# Altium integrated library Connector.IntLib: 213 symbols (part 1 of 2)
Pins are listed as number, name and electrical type; pins without a type are passive.

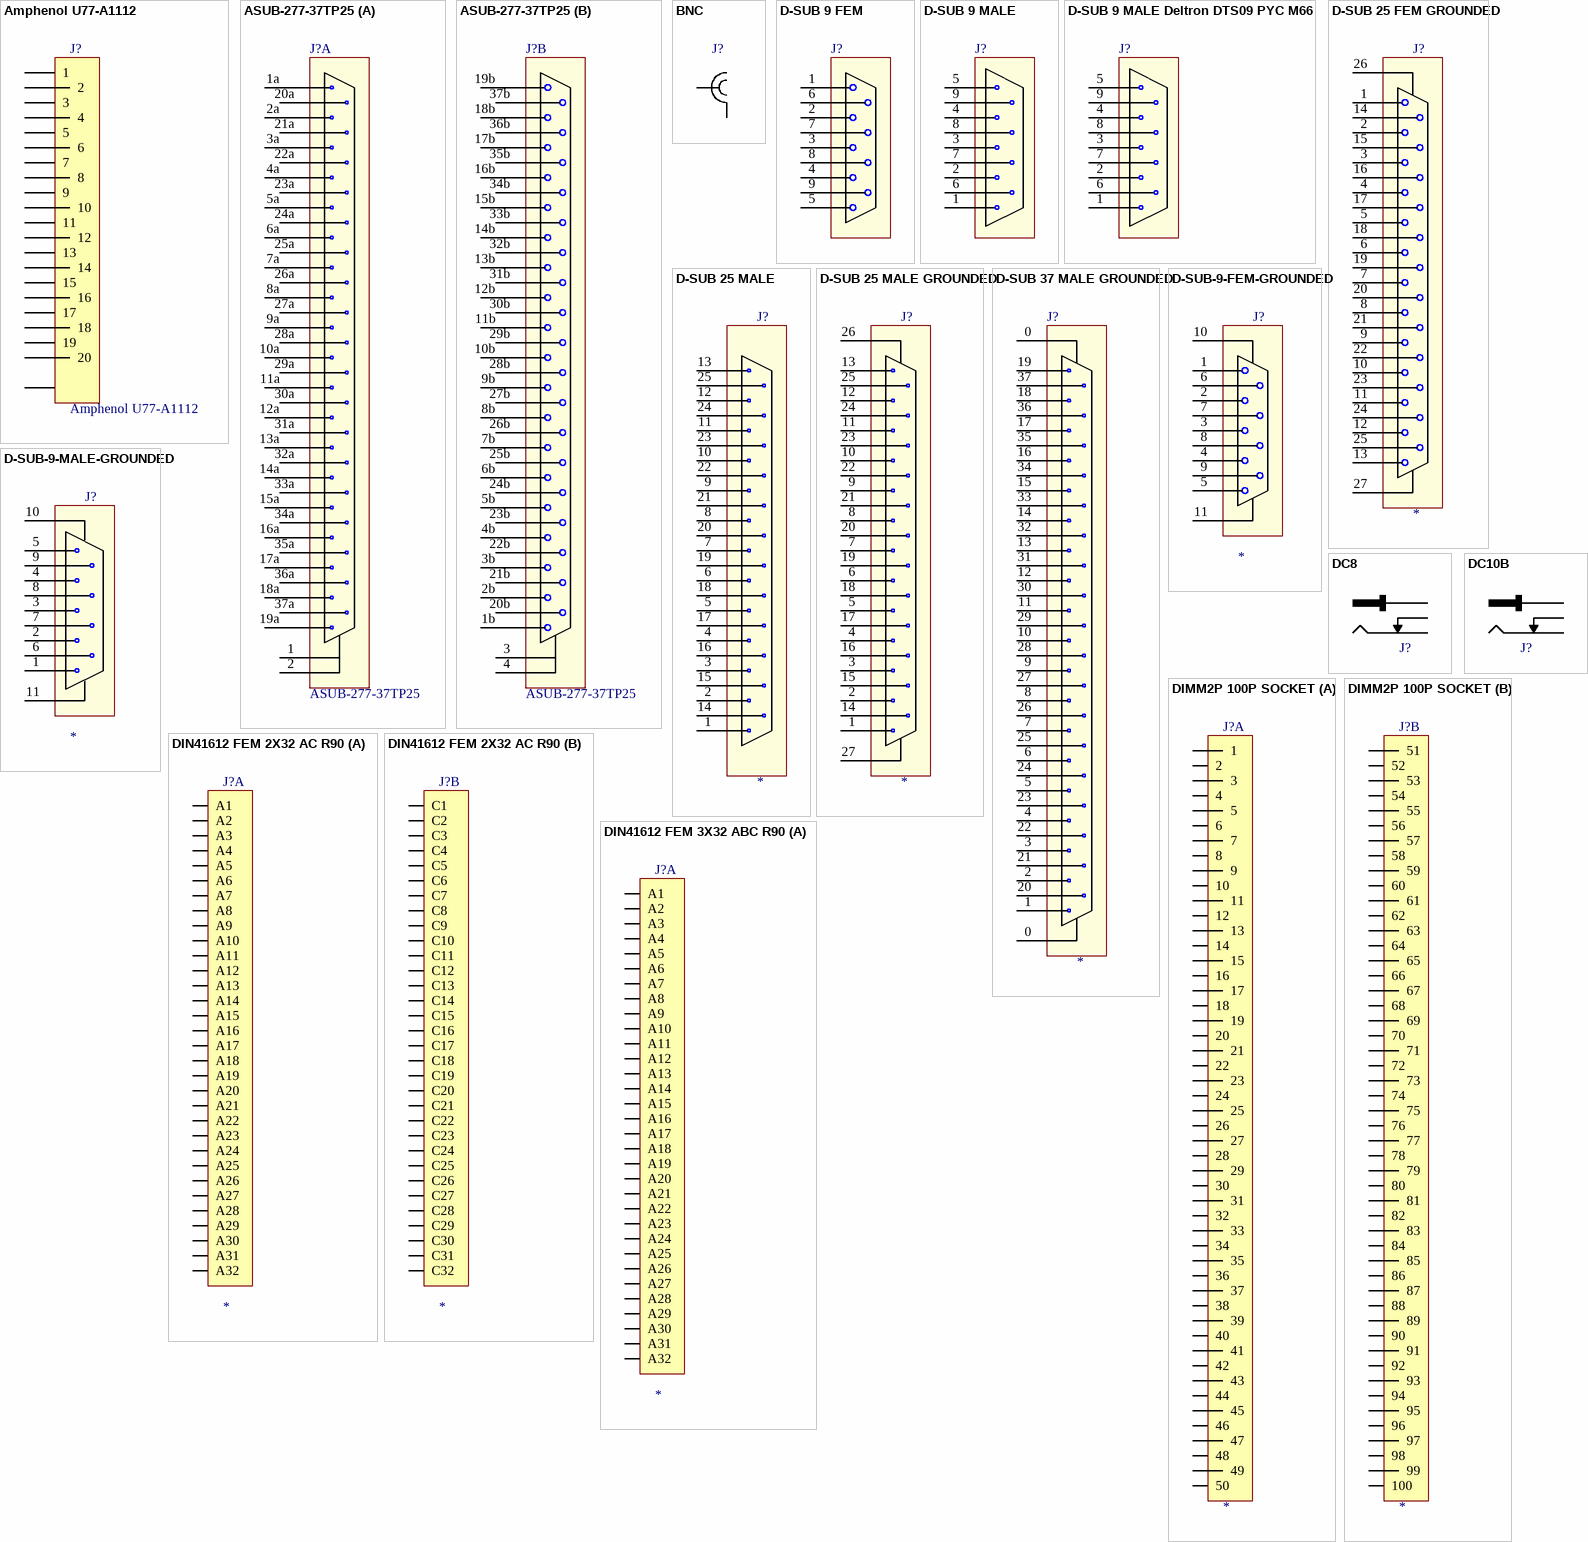
[diagram p0: symbols Amphenol U77-A1112 to DIN41612 FEM 3X32 ABC R90]

## Amphenol U77-A1112
designator J?
SFP20 High Speed Connector; Value: Amphenol U77-A1112
footprint Amphenol U77-A1112 (SFP20 High Speed Connector)
pins: 1, 2, 3, 4, 5, 6, 7, 8, 9, 10, 11, 12, 13, 14, 15, 16, 17, 18, 19, 20, 21 Case

## ASUB-277-37TP25
designator J?
D-Sub 25 pôles standard angle female, solder pin with nut and groundig board lock; Manufacturer: ASSMANN WSW Components; Value: ASUB-277-37TP25; DigiKey No: AE10967-ND
footprint ASUB-277-37TP25
part A pins: 1, 1a, 2, 2a, 3a, 4a, 5a, 6a, 7a, 8a, 9a, 10a, 11a, 12a, 13a, 14a, 15a, 16a, 17a, 18a, 19a, 20a, 21a, 22a, 23a, 24a, 25a, 26a, 27a, 28a, 29a, 30a, 31a, 32a, 33a, 34a, 35a, 36a, 37a
part B pins: 1b, 2b, 3, 3b, 4, 4b, 5b, 6b, 7b, 8b, 9b, 10b, 11b, 12b, 13b, 14b, 15b, 16b, 17b, 18b, 19b, 20b, 21b, 22b, 23b, 24b, 25b, 26b, 27b, 28b, 29b, 30b, 31b, 32b, 33b, 34b, 35b, 36b, 37b

## BNC
designator J?  (value not drawn)
footprint BNC TH RIGHT ANGLE TE CONNECTIVITY 1-1337543-0
footprint BNC TH Vertical Molex 73171-1900 (Connector BNC TH Vertical Molex 73171-1900)
pins: 1, 2

## D-SUB 9 FEM
designator J?  (value not drawn)
D-SUB 9 FEMALE, SOLDER CUP; value: *
footprint D-SUB 9 FEM
pins: 1, 2, 3, 4, 5, 6, 7, 8, 9

## D-SUB 9 MALE
designator J?  (value not drawn)
D-SUB 9 MALE, SOLDER CUP; value: *
footprint D-SUB 9 MALE
pins: 1, 2, 3, 4, 5, 6, 7, 8, 9

## D-SUB 9 MALE Deltron DTS09 PYC M66
designator J?  (value not drawn)
D-SUB 9 MALE Deltron DTS09 PYC M66; value: *
footprint D-SUB 9 MALE Deltron DTS09 PYC M66
pins: 1, 2, 3, 4, 5, 6, 7, 8, 9

## D-SUB 25 FEM GROUNDED
designator J?
D-Sub 25 pôles standard angle female, solder pin with nut and groundig board lock; value: *
footprint D-SUB 25 FEM (Deltron DTS 25 SYC M66)
pins: 1, 2, 3, 4, 5, 6, 7, 8, 9, 10, 11, 12, 13, 14, 15, 16, 17, 18, 19, 20, 21, 22, 23, 24, 25, 26, 27

## D-SUB 25 MALE
designator J?
D-Sub 25 pôles standard angle male, solder pin with nut and groundig board lock; value: *
footprint D-SUB 25 MALE 2 LAYERS (D-SUB 25 MALE 2 LAYERS PIN)
pins: 1, 2, 3, 4, 5, 6, 7, 8, 9, 10, 11, 12, 13, 14, 15, 16, 17, 18, 19, 20, 21, 22, 23, 24, 25

## D-SUB 25 MALE GROUNDED
designator J?
D-Sub 25 pôles standard angle male, solder pin with nut and groundig board lock; value: *
footprint D-SUB 25 MALE (Deltron DTS 25 PYC M66)
pins: 1, 2, 3, 4, 5, 6, 7, 8, 9, 10, 11, 12, 13, 14, 15, 16, 17, 18, 19, 20, 21, 22, 23, 24, 25, 26, 27

## D-SUB 37 MALE GROUNDED
designator J?
D-Sub 37 pôles standard straight male, solder pin with nut and groundig board lock; value: Harting 09 65 461 6712
footprint D-SUB 37 MALE STRAIGHT (Harting 09 65 461 6712)
pins: 0, 0, 1, 2, 3, 4, 5, 6, 7, 8, 9, 10, 11, 12, 13, 14, 15, 16, 17, 18, 19, 20, 21, 22, 23, 24, 25, 26, 27, 28, 29, 30, 31, 32, 33, 34, 35, 36, 37

## D-SUB-9-FEM-GROUNDED
designator J?
D-Sub 9 pôles standard angle female, solder pin with nut and groundig board lock; value: *
footprint D-SUB-9-FEM-ANGLE (D-SUB9F HARTING)
pins: 1, 2, 3, 4, 5, 6, 7, 8, 9, 10, 11

## D-SUB-9-MALE-GROUNDED
designator J?
D-Sub 9 pôles standard angle male, solder pin with nut and groundig board lock; value: *
footprint D-SUB-9-MALE-ANGLE (D-SUB9M HARTING)
pins: 1, 2, 3, 4, 5, 6, 7, 8, 9, 10, 11

## DC8
designator J?  (value not drawn)
DC Power Connector Cliff DC8; Value: DC8
footprint DC8 CLIFF (DC power Connector Cliff DC8)
pins: 1, 2, 3

## DC10B
designator J?  (value not drawn)
DC Power Connector Cliff DC10B; Value: DC10B
footprint DC10B CLIFF (DC power Connector Cliff DC10B)
pins: 1, 2, 3

## DIMM2P 100P SOCKET
designator J?
DIMM2P 100P SOCKET
footprint DIMM2P 100P SOCKET
part A pins: 1, 2, 3, 4, 5, 6, 7, 8, 9, 10, 11, 12, 13, 14, 15, 16, 17, 18, 19, 20, 21, 22, 23, 24, 25, 26, 27, 28, 29, 30, 31, 32, 33, 34, 35, 36, 37, 38, 39, 40, 41, 42, 43, 44, 45, 46, 47, 48, 49, 50
part B pins: 51, 52, 53, 54, 55, 56, 57, 58, 59, 60, 61, 62, 63, 64, 65, 66, 67, 68, 69, 70, 71, 72, 73, 74, 75, 76, 77, 78, 79, 80, 81, 82, 83, 84, 85, 86, 87, 88, 89, 90, 91, 92, 93, 94, 95, 96, 97, 98, 99, 100

## DIN41612 FEM 2X32 AC R90
designator J?
DIN41612 FEM 2X32 AC R90
footprint DIN41612 FEM 2x32 AC R90 (DIN41612 FEM 2X32 R90)
part A pins: A1, A2, A3, A4, A5, A6, A7, A8, A9, A10, A11, A12, A13, A14, A15, A16, A17, A18, A19, A20, A21, A22, A23, A24, A25, A26, A27, A28, A29, A30, A31, A32
part B pins: C1, C2, C3, C4, C5, C6, C7, C8, C9, C10, C11, C12, C13, C14, C15, C16, C17, C18, C19, C20, C21, C22, C23, C24, C25, C26, C27, C28, C29, C30, C31, C32

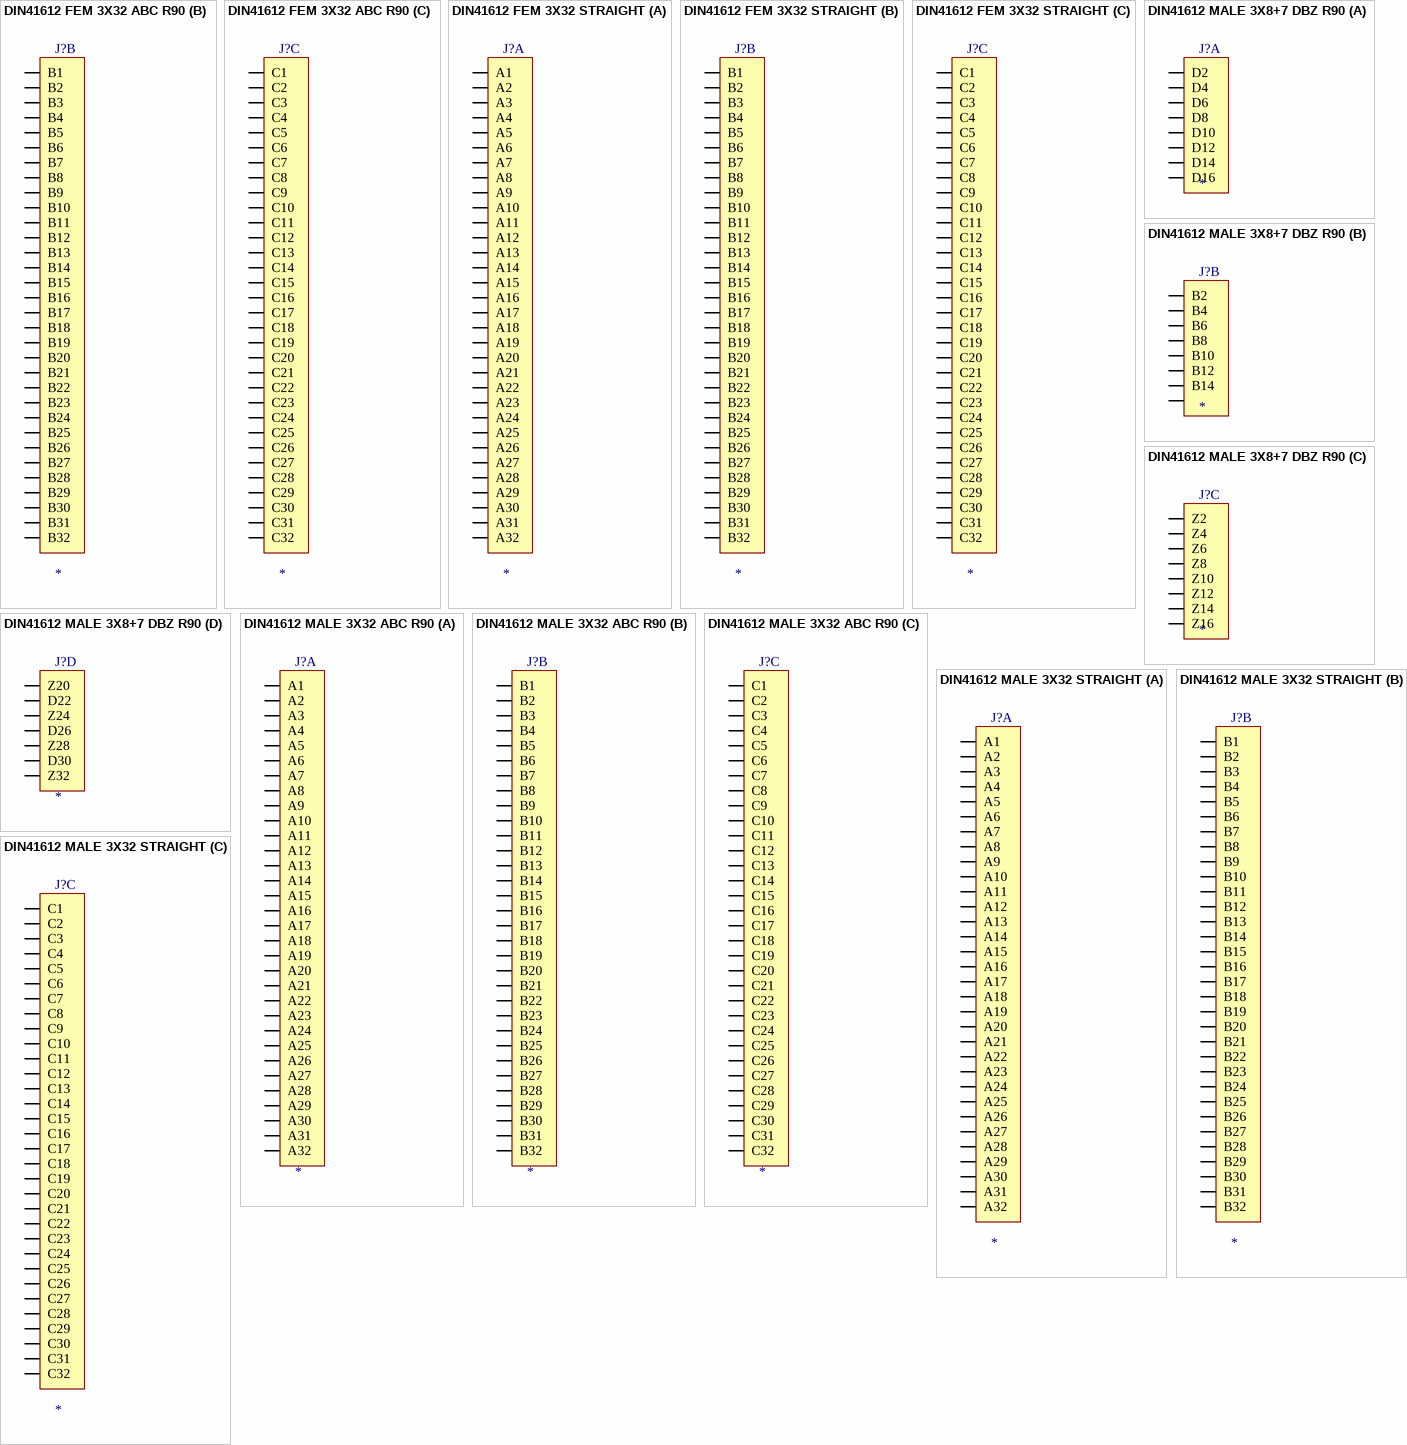
[diagram p1: symbols DIN41612 FEM 3X32 ABC R90 to DIN41612 MALE 3X32 STRAIGHT]

## DIN41612 FEM 3X32 ABC R90
designator J?
DIN41612 FEM 3X32 ABC R90
footprint DIN41612 FEM 3x32 ABC R90
part A pins: A1, A2, A3, A4, A5, A6, A7, A8, A9, A10, A11, A12, A13, A14, A15, A16, A17, A18, A19, A20, A21, A22, A23, A24, A25, A26, A27, A28, A29, A30, A31, A32
part B pins: B1, B2, B3, B4, B5, B6, B7, B8, B9, B10, B11, B12, B13, B14, B15, B16, B17, B18, B19, B20, B21, B22, B23, B24, B25, B26, B27, B28, B29, B30, B31, B32
part C pins: C1, C2, C3, C4, C5, C6, C7, C8, C9, C10, C11, C12, C13, C14, C15, C16, C17, C18, C19, C20, C21, C22, C23, C24, C25, C26, C27, C28, C29, C30, C31, C32

## DIN41612 FEM 3X32 STRAIGHT
designator J?
DIN41612 FEM 3X32 ABC STRAIGHT
footprint DIN41612 FEM 3x32 ABC Straight (DIN41612 FEM 3x32 ABC Straight Harting 09 03 296 6824)
part A pins: A1, A2, A3, A4, A5, A6, A7, A8, A9, A10, A11, A12, A13, A14, A15, A16, A17, A18, A19, A20, A21, A22, A23, A24, A25, A26, A27, A28, A29, A30, A31, A32
part B pins: B1, B2, B3, B4, B5, B6, B7, B8, B9, B10, B11, B12, B13, B14, B15, B16, B17, B18, B19, B20, B21, B22, B23, B24, B25, B26, B27, B28, B29, B30, B31, B32
part C pins: C1, C2, C3, C4, C5, C6, C7, C8, C9, C10, C11, C12, C13, C14, C15, C16, C17, C18, C19, C20, C21, C22, C23, C24, C25, C26, C27, C28, C29, C30, C31, C32

## DIN41612 MALE 3X8+7 DBZ R90
designator J?
DIN41612 MALE 3X8+7 DBZ R90 Harting 09 06 131 6922
footprint DIN41612 MALE 3X8+7 DBZ R90 (DIN41612 MALE 3X8+7 DBZ R90 Harting 09 06 131 6922)
part A pins: D2, D4, D6, D8, D10, D12, D14, D16
part B pins: B2, B4, B6, B8, B10, B12, B14, B16
part C pins: Z2, Z4, Z6, Z8, Z10, Z12, Z14, Z16
part D pins: D22, D26, D30, Z20, Z24, Z28, Z32

## DIN41612 MALE 3X32 ABC R90
designator J?
DIN41612 MALE 3X32 ABC R90
footprint DIN41612 MALE 3X32 ABC R90
part A pins: A1, A2, A3, A4, A5, A6, A7, A8, A9, A10, A11, A12, A13, A14, A15, A16, A17, A18, A19, A20, A21, A22, A23, A24, A25, A26, A27, A28, A29, A30, A31, A32
part B pins: B1, B2, B3, B4, B5, B6, B7, B8, B9, B10, B11, B12, B13, B14, B15, B16, B17, B18, B19, B20, B21, B22, B23, B24, B25, B26, B27, B28, B29, B30, B31, B32
part C pins: C1, C2, C3, C4, C5, C6, C7, C8, C9, C10, C11, C12, C13, C14, C15, C16, C17, C18, C19, C20, C21, C22, C23, C24, C25, C26, C27, C28, C29, C30, C31, C32

## DIN41612 MALE 3X32 STRAIGHT
designator J?
DIN41612 MALE 3X32 ABC STRAIGHT
footprint DIN41612 MALE 3x32 ABC Straight (DIN41612 MALE 3x32 ABC Straight Harting 09 73 196 7902)
part A pins: A1, A2, A3, A4, A5, A6, A7, A8, A9, A10, A11, A12, A13, A14, A15, A16, A17, A18, A19, A20, A21, A22, A23, A24, A25, A26, A27, A28, A29, A30, A31, A32
part B pins: B1, B2, B3, B4, B5, B6, B7, B8, B9, B10, B11, B12, B13, B14, B15, B16, B17, B18, B19, B20, B21, B22, B23, B24, B25, B26, B27, B28, B29, B30, B31, B32
part C pins: C1, C2, C3, C4, C5, C6, C7, C8, C9, C10, C11, C12, C13, C14, C15, C16, C17, C18, C19, C20, C21, C22, C23, C24, C25, C26, C27, C28, C29, C30, C31, C32

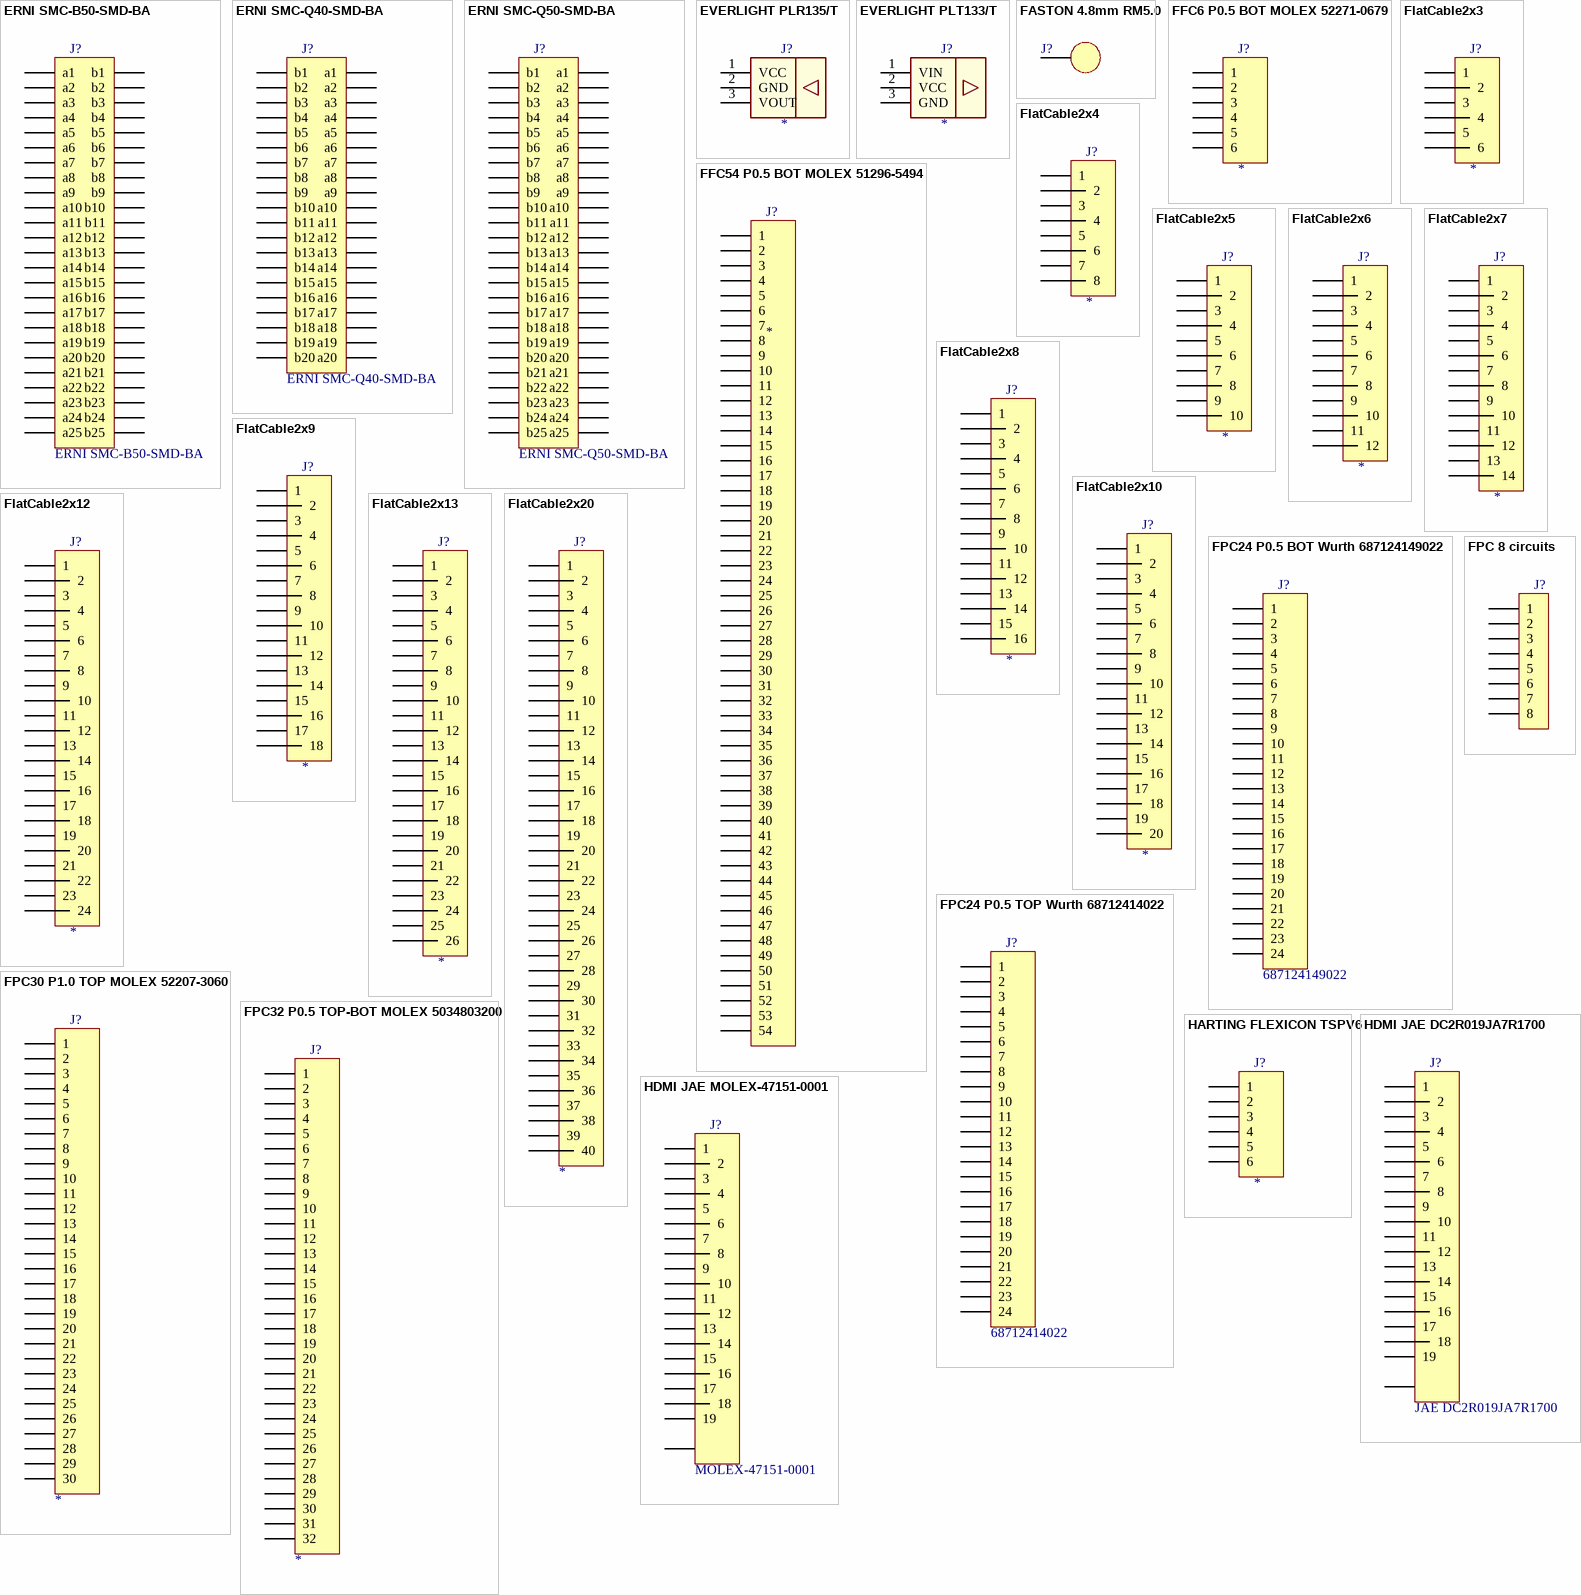
[diagram p2: symbols ERNI SMC-B50-SMD-BA to HDMI JAE MOLEX-47151-0001]

## ERNI SMC-B50-SMD-BA
designator J?
Female 1.27 pitch 2x25 pin connector
footprint ERNI SMC-B50-SMD-BA (Footprint not found)
pins: a1, a2, a3, a4, a5, a6, a7, a8, a9, a10, a11, a12, a13, a14, a15, a16, a17, a18, a19, a20, a21, a22, a23, a24, a25, b1, b2, b3, b4, b5, b6, b7, b8, b9, b10, b11, b12, b13, b14, b15, b16, b17, b18, b19, b20, b21, b22, b23, b24, b25

## ERNI SMC-Q40-SMD-BA
designator J?
Male 1.27 pitch 2x20 pin connector
footprint ERNI SMC-Q40-SMD-BA (Male 1.27 pitch 2x20 pin connector, 6.75 height)
pins: a1, a2, a3, a4, a5, a6, a7, a8, a9, a10, a11, a12, a13, a14, a15, a16, a17, a18, a19, a20, b1, b2, b3, b4, b5, b6, b7, b8, b9, b10, b11, b12, b13, b14, b15, b16, b17, b18, b19, b20

## ERNI SMC-Q50-SMD-BA
designator J?
Male 1.27 pitch 2x25 pin connector
footprint ERNI SMC-Q50-SMD-BA (Male 1.27 pitch 2x20 pin connector, 6.75 height)
pins: a1, a2, a3, a4, a5, a6, a7, a8, a9, a10, a11, a12, a13, a14, a15, a16, a17, a18, a19, a20, a21, a22, a23, a24, a25, b1, b2, b3, b4, b5, b6, b7, b8, b9, b10, b11, b12, b13, b14, b15, b16, b17, b18, b19, b20, b21, b22, b23, b24, b25

## EVERLIGHT PLR135/T
designator J?
EVERLIGHT Optic Receiver PLR135/T - Transmitter PLT133/T; value: *
footprint EVERLIGHT PLx13x/T (Optic Receiver PLR135/T - Transmitter PLT133/T)
pins: 1 VCC, 2 GND, 3 VOUT

## EVERLIGHT PLT133/T
designator J?
EVERLIGHT Optic Receiver PLR135/T - Transmitter PLT133/T; value: *
footprint EVERLIGHT PLx13x/T (Optic Receiver PLR135/T - Transmitter PLT133/T)
pins: 1 VIN, 2 VCC, 3 GND

## FASTON 4.8mm RM5.0
designator J?, comment SOCKET 2PIN  (value not drawn)
FASTON 4.8mm RM5.0
footprint FASTON 4.8mm RM5 (Faston 4.8mm RM5)
pins: 1, 2, 2

## FFC6 P0.5 BOT MOLEX 52271-0679
designator J?
FFC/FPC Connector, Right-Angle, Surface Mount, ZIF, Bottom Contact Style, 6 Circuits
footprint FFC6 P0.5 BOT MOLEX 52271-0679
pins: 1, 2, 3, 4, 5, 6

## FFC54 P0.5 BOT MOLEX 51296-5494
designator J?
FFC/FPC Connector, 1.30mm Height, Right-Angle, Surface Mount, ZIF, Bottom Contact Style, 54 Circuits
footprint FFC54 P0.5 BOT MOLEX 52271-0679 (FFC/FPC Connector, Right-Angle, Surface Mount, ZIF, Bottom Contact Style, 6 Circuits)
pins: 1, 2, 3, 4, 5, 6, 7, 8, 9, 10, 11, 12, 13, 14, 15, 16, 17, 18, 19, 20, 21, 22, 23, 24, 25, 26, 27, 28, 29, 30, 31, 32, 33, 34, 35, 36, 37, 38, 39, 40, 41, 42, 43, 44, 45, 46, 47, 48, 49, 50, 51, 52, 53, 54

## FlatCable2x3
designator J?
FlatCable2x3
footprint FlatCable2x3 2MM Right Angle TH FCI 98614-G61-06ULF
footprint FlatCable2x3 2MM Straight TH FCI 98414-G06-06ULF
footprint FlatCable2x3 2MM Straight SMD FCI 98414-G52-06ALF
footprint FlatCable2x3 2.54MM Straight TH (FlatCable2x3 2.54MM Straight TH, DIN 41651, Generic)
footprint FlatCable2x3 2.54MM RIGHT ANGLE TH (FlatCable2x3 2.54MM Right Angle TH, DIN 41651, Generic)
footprint FlatCable2x3 2.54MM A Straight TH (FlatCable2x3 2.54MM Straight TH, DIN 41651, Generic)
pins: 1, 2, 3, 4, 5, 6

## FlatCable2x4
designator J?
FlatCable2x4
footprint FlatCable2x4 2MM Right Angle TH FCI 98614-G61-08ULF
footprint FlatCable2x4 2MM Straight TH FCI 98414-G06-08ULF
footprint FlatCable2x4 2MM Straight SMD FCI 98414-G52-08ALF
pins: 1, 2, 3, 4, 5, 6, 7, 8

## FlatCable2x5
designator J?
FlatCable2x5
footprint FlatCable2x5 2MM Straight TH FCI 98414-G06-10ULF
footprint FlatCable2x5 2MM Right Angle TH FCI 98614-G61-10ULF
footprint FlatCable2x5 2MM Straight SMD FCI 98414-G52-10ALF
footprint FlatCable2x5 2.54MM Straight TH (FlatCable2x5 2.54MM Straight TH, DIN 41651, Generic)
footprint FlatCable2x5 2.54MM RIGHT ANGLE TH (FlatCable2x5 2.54MM Right Angle TH, DIN 41651, Generic)
footprint FlatCable2x5 2.54MM A Straight TH (FlatCable2x5 2.54MM Straight TH, DIN 41651, Generic)
footprint FlatCable2x5 1.27MM Straight TH (FlatCable2x5 2MM Straight TH)
footprint FlatCable2x5 1.27MM Straight SMD (FlatCable2x5 2MM Straight SMD, FCI 20021521-00010T1LF)
footprint FlatCable2x5 1.27MM Straight SMD Mini (FlatCable2x5 2MM Straight SMD, Samtec FTSH-105-01-L-DV-K-TR)
pins: 1, 2, 3, 4, 5, 6, 7, 8, 9, 10

## FlatCable2x6
designator J?
FlatCable2x6
footprint FlatCable2x6 2MM Right Angle TH FCI 98614-G61-12ULF
footprint FlatCable2x6 2MM Straight TH FCI 98414-G06-12ULF
footprint FlatCable2x6 2MM Straight SMD FCI 98414-G52-12ALF
pins: 1, 2, 3, 4, 5, 6, 7, 8, 9, 10, 11, 12

## FlatCable2x7
designator J?
FlatCable2x7
footprint FlatCable2x7 2MM Right Angle TH FCI 98614-G61-14ULF
footprint FlatCable2x7 2MM Straight TH FCI 98414-G06-14ULF
footprint FlatCable2x7 2MM Straight SMD FCI 98414-G52-14ALF
footprint FlatCable2x7 2.54MM Straight TH (FlatCable2x7 2.54MM Straight TH, DIN 41651, Generic)
footprint FlatCable2x7 2.54MM RIGHT ANGLE TH (FlatCable2x7 2.54MM Right Angle TH, DIN 41651, Generic)
footprint FlatCable2x7 2.54MM A Straight TH (FlatCable2x7 2.54MM Straight TH, DIN 41651, Generic)
pins: 1, 2, 3, 4, 5, 6, 7, 8, 9, 10, 11, 12, 13, 14

## FlatCable2x8
designator J?
FlatCable2x8
footprint FlatCable2x8 2MM Right Angle TH FCI 98614-G61-16ULF
footprint FlatCable2x8 2MM Straight TH FCI 98414-G06-16ULF
footprint FlatCable2x8 2MM Straight SMD FCI 98414-G52-16ALF
footprint FlatCable2x8 2.54MM Straight TH (FlatCable2x8 2.54MM Straight TH, DIN 41651, Generic)
footprint FlatCable2x8 2.54MM RIGHT ANGLE TH (FlatCable2x8 2.54MM Right Angle TH, DIN 41651, Generic)
footprint FlatCable2x8 2.54MM A Straight TH (FlatCable2x8 2.54MM Straight TH, DIN 41651, Generic)
pins: 1, 2, 3, 4, 5, 6, 7, 8, 9, 10, 11, 12, 13, 14, 15, 16

## FlatCable2x9
designator J?
FlatCable2x9
footprint FlatCable2x9 2MM Right Angle TH FCI 98614-G61-18ULF
footprint FlatCable2x9 2MM Straight TH FCI 98414-G06-18ULF
footprint FlatCable2x9 2MM Straight SMD FCI 98414-G52-18ALF
pins: 1, 2, 3, 4, 5, 6, 7, 8, 9, 10, 11, 12, 13, 14, 15, 16, 17, 18

## FlatCable2x10
designator J?
FlatCable2x10
footprint FlatCable2x10 2MM Right Angle TH FCI 98614-G61-20ULF
footprint FlatCable2x10 2MM Straight TH FCI 98414-G06-20ULF
footprint FlatCable2x10 2MM Straight SMD FCI 98414-G52-20ALF
footprint FlatCable2x10 2.54MM Straight TH (FlatCable2x10 2.54MM Straight TH, DIN 41651, Generic)
footprint FlatCable2x10 2.54MM RIGHT ANGLE TH (FlatCable2x10 2.54MM Right Angle TH, DIN 41651, Generic)
footprint FlatCable2x10 2.54MM A Straight TH (FlatCable2x10 2.54MM Straight TH, DIN 41651, Generic)
pins: 1, 2, 3, 4, 5, 6, 7, 8, 9, 10, 11, 12, 13, 14, 15, 16, 17, 18, 19, 20

## FlatCable2x12
designator J?
FlatCable2x12
footprint FlatCable2x12 2MM Right Angle TH FCI 98614-G61-24ULF
footprint FlatCable2x12 2MM Straight TH FCI 98414-G06-24ULF
footprint FlatCable2x12 2MM Straight SMD FCI 98414-G52-24ALF
pins: 1, 2, 3, 4, 5, 6, 7, 8, 9, 10, 11, 12, 13, 14, 15, 16, 17, 18, 19, 20, 21, 22, 23, 24

## FlatCable2x13
designator J?
FlatCable2x13
footprint FlatCable2x13 2.54MM Straight TH (FlatCable2x13 2.54MM Straight TH, DIN 41651, Generic)
footprint FlatCable2x13 2.54MM RIGHT ANGLE TH (FlatCable2x13 2.54MM Right Angle TH, DIN 41651, Generic)
footprint FlatCable2x13 2.54MM A Straight TH (FlatCable2x13 2.54MM Straight TH, DIN 41651, Generic)
pins: 1, 2, 3, 4, 5, 6, 7, 8, 9, 10, 11, 12, 13, 14, 15, 16, 17, 18, 19, 20, 21, 22, 23, 24, 25, 26

## FlatCable2x20
designator J?
FlatCable2x20
footprint FlatCable2x20 2.54MM Straight TH (FlatCable2x20 2.54MM Straight TH, DIN 41651, Generic)
pins: 1, 2, 3, 4, 5, 6, 7, 8, 9, 10, 11, 12, 13, 14, 15, 16, 17, 18, 19, 20, 21, 22, 23, 24, 25, 26, 27, 28, 29, 30, 31, 32, 33, 34, 35, 36, 37, 38, 39, 40

## FPC24 P0.5 BOT Wurth 687124149022
designator J?, comment 687124149022
0.50mm SMT ZIF Horizontal Hinge Type Bottom Contact, 24p; Value: 687124149022
footprint FPC24 Wurth 687124149022 (0.50mm SMT ZIF Horizontal Hinge Type Bottom Contact, 24p)
pins: 1, 2, 3, 4, 5, 6, 7, 8, 9, 10, 11, 12, 13, 14, 15, 16, 17, 18, 19, 20, 21, 22, 23, 24

## FPC24 P0.5 TOP Wurth 68712414022
designator J?, comment 68712414022
0.50mm SMT ZIF Horizontal Hinge Type Top Contact, 24p; Value: 68712414022
footprint FPC24 Wurth 68712414022 (0.50mm SMT ZIF Horizontal Hinge Type Top Contact, 24p)
pins: 1, 2, 3, 4, 5, 6, 7, 8, 9, 10, 11, 12, 13, 14, 15, 16, 17, 18, 19, 20, 21, 22, 23, 24

## FPC30 P1.0 TOP MOLEX 52207-3060
designator J?
FPC Connector, 1.00mm Pitch, Right-Angle, Surface Mount, ZIF, Top contact Style, 30 Circuits; Value: *
footprint MOLEX 52207-3060 (30 Position FFC, FPC Connector Contacts, Top (1.0mm) Surface Mount, Right Angle)
pins: 1, 2, 3, 4, 5, 6, 7, 8, 9, 10, 11, 12, 13, 14, 15, 16, 17, 18, 19, 20, 21, 22, 23, 24, 25, 26, 27, 28, 29, 30

## FPC32 P0.5 TOP-BOT MOLEX 5034803200
designator J?
FPC Connector, 1.00mm Height, Right-Angle, Surface Mount, ZIF, Bottom Contact Style, 32 Circuits; Value: *
footprint MOLEX 5034803200 (32 Position FFC, FPC Connector Contacts, Top and Bottom 0.020" (0.50mm) Surface Mount, Right Angle)
pins: 1, 2, 3, 4, 5, 6, 7, 8, 9, 10, 11, 12, 13, 14, 15, 16, 17, 18, 19, 20, 21, 22, 23, 24, 25, 26, 27, 28, 29, 30, 31, 32

## FPC 8 circuits
designator J?  (value not drawn)  (no BOM)
FPC 8 circuits; Value: *
footprint FPC 8 circuits P0.5mm Top connection (FPC, 8 circuits, P0.5mm, Top connection)
pins: 1, 2, 3, 4, 5, 6, 7, 8

## HARTING FLEXICON TSPV6
designator J?
Connector, PCB terminal block pitch 2.54, Vertical 6positions
footprint HARTING FLEXICON TSPV6 (Connector, PCB terminal block pitch 2.54, Vertical)
pins: 1, 2, 3, 4, 5, 6

## HDMI JAE DC2R019JA7R1700
designator J?, comment JAE DC2R019JA7R1700
HDMI standard Type C HDMI Mini; Value: JAE DC2R019JA7R1700
footprint HDMI JAE DC2R019JA7R1700 (HDMI standard Type C HDMI Mini)
pins: 0 Case, 1, 2, 3, 4, 5, 6, 7, 8, 9, 10, 11, 12, 13, 14, 15, 16, 17, 18, 19

## HDMI JAE MOLEX-47151-0001
designator J?, comment MOLEX-47151-0001
HDMI standard; Value: MOLEX-47151-0001
footprint HDMI MOLEX-47151-0001 (SMD, 19-Leads, Body 15x12.15mm, Pitch 0.5mm)
pins: 0 Case, 1, 2, 3, 4, 5, 6, 7, 8, 9, 10, 11, 12, 13, 14, 15, 16, 17, 18, 19

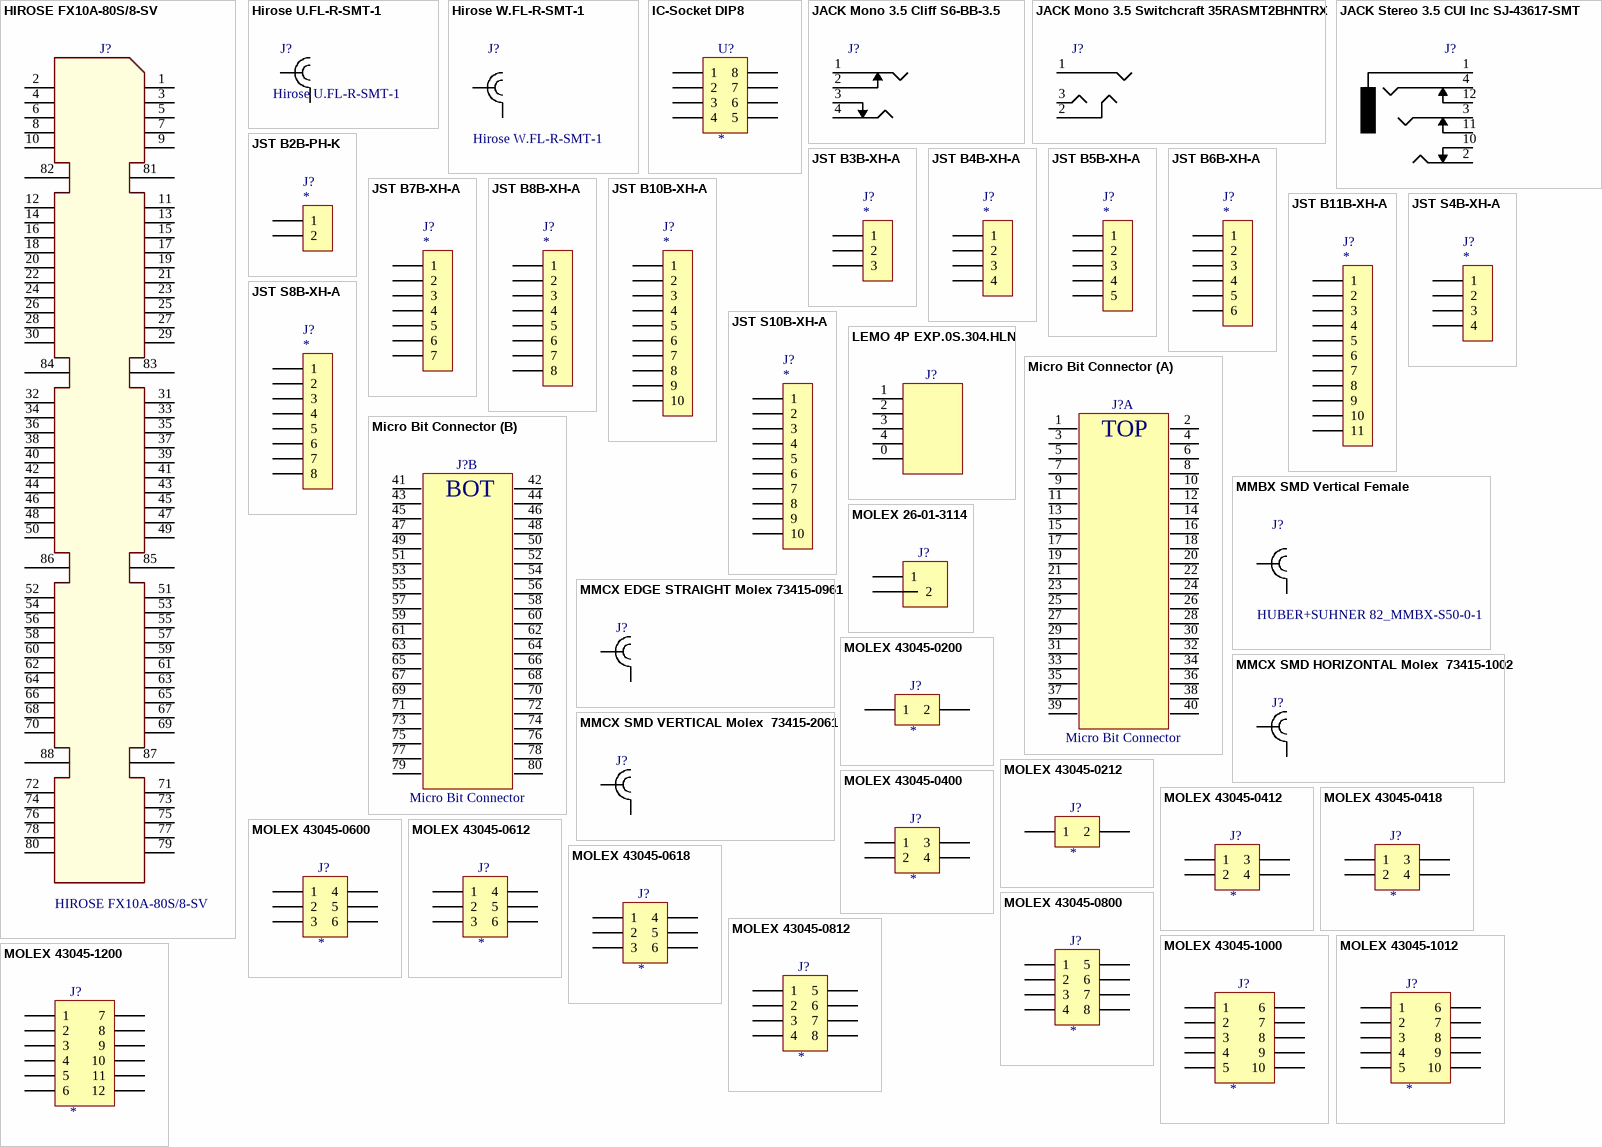
[diagram p3: symbols HIROSE FX10A-80S/8-SV to MOLEX 43045-1200]

## HIROSE FX10A-80S/8-SV
designator J?
15+  Gbps 0.5mm pitch Stacking Connectors
footprint HIROSE FX10A-80S/8-SV (15+  Gbps 0.5mm pitch Stacking Connectors)
pins: 1, 2, 3, 4, 5, 6, 7, 8, 9, 10, 11, 12, 13, 14, 15, 16, 17, 18, 19, 20, 21, 22, 23, 24, 25, 26, 27, 28, 29, 30, 31, 32, 33, 34, 35, 36, 37, 38, 39, 40, 41, 42, 43, 44, 45, 46, 47, 48, 49, 50, 51, 52, 53, 54, 55, 56, 57, 58, 59, 60, 61, 62, 63, 64, 65, 66, 67, 68, 69, 70, 71, 72, 73, 74, 75, 76, 77, 78, 79, 80, 81, 82, 83, 84, 85, 86, 87, 88

## Hirose U.FL-R-SMT-1
designator J?
Micro RF Connectors / Coaxial Connectors SMT; Value: Hirose U.FL-R-SMT-1
footprint Hirose U.FL-R-SMT-1 (RF Connectors / Coaxial Connectors SMT)
pins: 1, 2

## Hirose W.FL-R-SMT-1
designator J?
Micro RF Connectors / Coaxial Connectors SMT; Value: Hirose W.FL-R-SMT-1
footprint HIROSE W.FL-R-SMT-1 (RF Connectors / Coaxial Connectors SMT)
pins: 1, 2

## IC-Socket DIP8
designator U?
Micro-Fit 3.0 Right-Angle Header, 3.00mm Pitch, Dual Row, 8 Circuits
footprint IC-Socket A08-LC-TT (IC-Socket A08-LC-TT, DIP8)
pins: 1, 2, 3, 4, 5, 6, 7, 8

## JACK Mono 3.5 Cliff S6-BB-3.5
designator J?  (value not drawn)
JACK Mono 3.5 Cliff S6-BB-3.5; Value: *
footprint JACK Mono 3.5 Cliff S6-BB-3.5
pins: 1 P1, 2 SW1, 3 SW2, 4 P2

## JACK Mono 3.5 Switchcraft 35RASMT2BHNTRX
designator J?  (value not drawn)
JACK Mono 3.5 Switchcraft 35RASMT2BHNTRX; Value: *
footprint JACK Mono 3.5 Switchcraft 35RASMT2BHNTRX
pins: 1 GND, 2 R, 3 L

## JACK Stereo 3.5 CUI Inc SJ-43617-SMT
designator J?  (value not drawn)
Value: JACK Stereo 3.5 CUI Inc SJ-43617-SMT
footprint Jack Stereo Cui Inc SJ-43617-SMT (JACK Mono 3.5 Switchcraft 35RASMT2BHNTRX)
pins: 1 Sleeve, 2 Tip, 3 Ring1, 4 Ring2, 10 Tip SW, 11 Ring1 SW, 12 Ring 2 SW

## JST B2B-PH-K
designator J?
JST 2mm pitch TH top entry connector
footprint JST B2B-PH-K (JST 2mm pitch TH top entry connector)
pins: 1, 2

## JST B3B-XH-A
designator J?
JST 2.5mm pitch TH top entry connector
footprint JST B3B-XH-A (JST 2.5mm pitch TH top entry connector)
pins: 1, 2, 3

## JST B4B-XH-A
designator J?
JST 2.5mm pitch TH top entry connector
footprint JST B4B-XH-A (JST 2.5mm pitch TH top entry connector)
pins: 1, 2, 3, 4

## JST B5B-XH-A
designator J?
JST 2.5mm pitch TH top entry connector
footprint JST B5B-XH-A (JST 2.5mm pitch TH top entry connector)
pins: 1, 2, 3, 4, 5

## JST B6B-XH-A
designator J?
JST 2.5mm pitch TH top entry connector
footprint JST B6B-XH-A (JST 2.5mm pitch TH top entry connector)
pins: 1, 2, 3, 4, 5, 6

## JST B7B-XH-A
designator J?
JST 2.5mm pitch TH top entry connector
footprint JST B7B-XH-A (JST 2.5mm pitch TH top entry connector)
pins: 1, 2, 3, 4, 5, 6, 7

## JST B8B-XH-A
designator J?
JST 2.5mm pitch TH top entry connector
footprint JST B8B-XH-A (JST 2.5mm pitch TH top entry connector)
pins: 1, 2, 3, 4, 5, 6, 7, 8

## JST B10B-XH-A
designator J?
JST 2.5mm pitch TH top entry connector
footprint JST B10B-XH-A (JST 2.5mm pitch TH top entry connector)
pins: 1, 2, 3, 4, 5, 6, 7, 8, 9, 10

## JST B11B-XH-A
designator J?
JST 2.5mm pitch TH top entry connector
footprint JST B11B-XH-A (JST 2.5mm pitch TH top entry connector)
pins: 1, 2, 3, 4, 5, 6, 7, 8, 9, 10, 11

## JST S4B-XH-A
designator J?
JST 2.5mm pitch TH side entry connector
footprint JST S4B-XH-A (JST 2.5mm pitch TH side entry connector)
pins: 1, 2, 3, 4

## JST S8B-XH-A
designator J?
JST 2.5mm pitch TH side entry connector
footprint JST S8B-XH-A (Footprint not found)
pins: 1, 2, 3, 4, 5, 6, 7, 8

## JST S10B-XH-A
designator J?
JST 2.5mm pitch TH side entry connector
footprint JST S10B-XH-A (JST 2.5mm pitch TH side entry connector)
pins: 1, 2, 3, 4, 5, 6, 7, 8, 9, 10

## LEMO 4P EXP.0S.304.HLN
designator J?, comment EXP.0S.304.HLN  (value not drawn)
LEMO 4P EXP.0S.304.HLN; value: EXP.0S.304.HLN
footprint LEMO EXP.0S.304.HLN (LEMO RIGHT ANGLE 4P + GND)
pins: 0 Ground, 1, 2, 3, 4

## Micro Bit Connector
designator J?
0.50MM TERMINAL/SOCKET COMBO,80 PINS.; Value: *
footprint Micro Bit Connector (Connector receptacle for pcb 1.6mm)
footprint Micro Bit Connector With board (Connector Micro bit with board)
part A pins: 1, 2, 3, 4, 5, 6, 7, 8, 9, 10, 11, 12, 13, 14, 15, 16, 17, 18, 19, 20, 21, 22, 23, 24, 25, 26, 27, 28, 29, 30, 31, 32, 33, 34, 35, 36, 37, 38, 39, 40
part B pins: 41, 42, 43, 44, 45, 46, 47, 48, 49, 50, 51, 52, 53, 54, 55, 56, 57, 58, 59, 60, 61, 62, 63, 64, 65, 66, 67, 68, 69, 70, 71, 72, 73, 74, 75, 76, 77, 78, 79, 80
part A text: TOP
part B text: BOT

## MMBX SMD Vertical Female
designator J?, comment HUBER+SUHNER 82_MMBX-S50-0-1
Value: HUBER+SUHNER 82_MMBX-S50-0-1
footprint MMBX SMD Vertical Female
pins: 1, 2

## MMCX EDGE STRAIGHT Molex 73415-0961
designator J?, comment 73415-0961  (value not drawn)
MMCX EDGE STRAIGHT Molex 73415-0961; Value: 73415-0961
footprint MMCX EDGE STRAIGHT Molex 73415-0961 (Connector MMCX, Board edge mount, Molex 73415-0961)
pins: 1, 2

## MMCX SMD HORIZONTAL Molex  73415-1002
designator J?, comment 73415-1002  (value not drawn)
MMCX SMD HORIZONTAL Molex  73415-1002; Value: 73415-1002
footprint MMCX SMD VERTICAL Molex  73415-1002 (Footprint not found)
pins: 1, 2

## MMCX SMD VERTICAL Molex  73415-2061
designator J?, comment 73415-2061  (value not drawn)
MMCX SMD VERTICAL Molex  73415-2061; Value: 73415-2061
footprint MMCX SMD VERTICAL Molex  73415-2061
pins: 1, 2

## MOLEX 26-01-3114
designator J?  (value not drawn)
Mini-Fit Jr. Header, Dual Row, Right Angle, 2 Circuits; Value: *
footprint MOLEX 26-01-3114 (MINI-FIT 5.5 JR RIGHT ANGLE HEADER)
pins: 1, 2
